# Altium integrated library Lattice CPLD ispLSI.IntLib: 471 symbols (part 21 of 26)
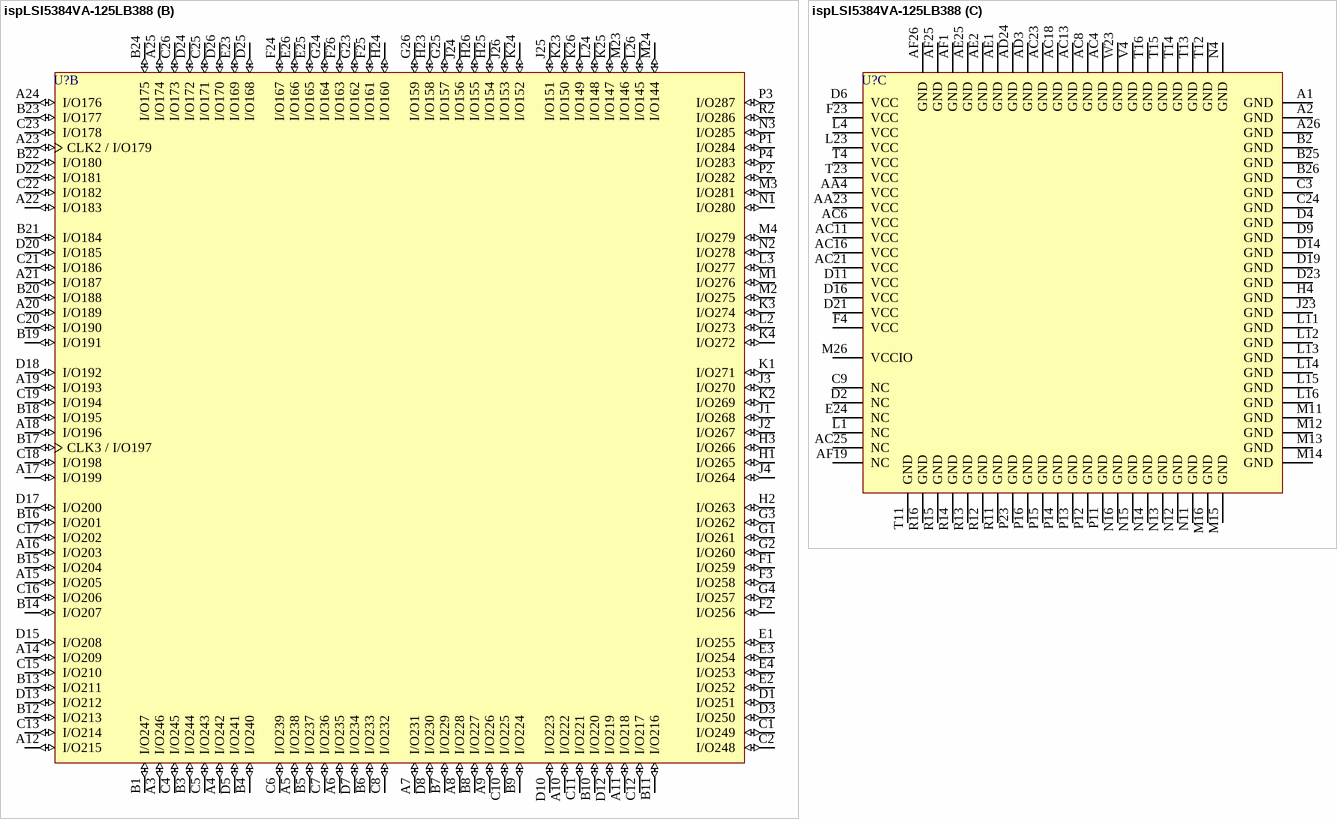
[diagram p251: symbol ispLSI5384VA-125LB388]

## ispLSI5384VA-125LB388
designator U?
In-System Programmable 3.3V SuperWIDE High Density PLD; Published: 17-Jul-2002; LatestRevisionDate: 13-Apr-2006; LatestRevisionNote: IPC-7351 Footprint Added.; DatasheetVersion: Mar-2001; PackageVersion: pkg_32, Aug-2005; PackageReference: BGA388; Publisher: Altium Limited; PackageDescription: 388-Ball Ball Grid Array (BGA388); ComponentLink1Description: Manufacturer Link; ComponentLink1URL: http://www.latticesemi.com/products/mature/index.cfm; ComponentLink2Description: Datasheet; ComponentLink2URL: http://www.latticesemi.com/account/_download.cfm?AMID=816
footprint BGA388 (BGA, 388-Leads, Body 35x35mm, Pitch 1.27mm)
3D model 5384VA-BGA388 (388-Ball Ball Grid Array (BGA388))
part A pins: A13 CLK0 (in), AA1 I/O18 (io), AA2 I/O16 (io), AA3 I/O22 (io), AA24 I/O114 (io), AA25 I/O112 (io), AA26 I/O115 (io), AB1 I/O21 (io), AB2 I/O20 (io), AB3 I/O26 (io), AB4 I/O24 (io), AB23 I/O109 (io), AB24 I/O110 (io), AB25 I/O108 (io), AB26 I/O111 (io), AC1 I/O25 (io), AC2 I/O23 (io), AC3 I/O28 (io), AC5 I/O37 (io), AC7 I/O41 (io), AC9 I/O48 (io), AC10 I/O56 (io), AC12 I/O64 (io), AC14 I/O68 (io), AC15 I/O75 (io), AC17 I/O79 (io), AC19 I/O86 (io), AC20 I/O90 (io), AC22 I/O97 (io), AC24 I/O106 (io), AC26 I/O107 (io), AD1 I/O29 (io), AD2 I/O27 (io), AD4 I/O34 (io), AD5 I/O38 (io), AD6 I/O42 (io), AD7 I/O46 (io), AD8 I/O50 (io), AD9 I/O54 (io), AD10 I/O58 (io), AD11 I/O62 (io), AD12 I/O66 (io), AD13 GOE1 (in), AD14 I/O70 (io), AD15 I/O73 (io), AD16 I/O77 (io), AD17 I/O81 (io), AD18 I/O84 (io), AD19 I/O88 (io), AD20 I/O92 (io), AD21 I/O95 (io), AD22 I/O99 (io), AD23 I/O101 (io), AD25 I/O104 (io), AD26 I/O105 (io), AE3 I/O31 (io), AE4 I/O33 (io), AE5 I/O36 (io), AE6 I/O40 (io), AE7 I/O44 (io), AE8 I/O47 (io), AE9 I/O51 (io), AE10 I/O53 (io), AE11 I/O57 (io), AE12 I/O60 (io), AE13 I/O63 (io), AE14 I/O67 (io), AE15 I/O69 (io), AE16 I/O72 (io), AE17 I/O76 (io), AE18 I/O80 (io), AE19 I/O83 (io), AE20 I/O85 (io), AE21 I/O89 (io), AE22 I/O93 (io), AE23 I/O96 (io), AE24 I/O100 (io), AE26 I/O103 (io), AF2 I/O30 (io), AF3 I/O32 (io), AF4 I/O35 (io), AF5 I/O39 (io), AF6 I/O43 (io), AF7 I/O45 (io), AF8 I/O49 (io), AF9 I/O52 (io), AF10 I/O55 (io), AF11 I/O59 (io), AF12 I/O61 (io), AF13 I/O65 (io), AF14 GOE0 (in), AF15 I/O71 (io), AF16 I/O74 (io), AF17 I/O78 (io), AF18 I/O82 (io), AF20 I/O87 (io), AF21 I/O91 (io), AF22 I/O94 (io), AF23 I/O98 (io), AF24 I/O102 (io), C14 CLK1 (in), L25 GSET/GRST (in), M25 I/O143 (io), N23 I/O140 (io), N24 TDO (out), N25 I/O139 (io), N26 I/O141 (io), P24 I/O142 (io), P25 I/O135 (io), P26 I/O137 (io), R1 TMS (in), R3 TDI (in), R4 I/O1 (io), R23 I/O136 (io), R24 I/O138 (io), R25 I/O132 (io), R26 I/O133 (io), T1 I/O0/TOE (io), T2 TCK (in), T3 I/O3 (io), T24 I/O134 (io), T25 I/O129 (io), T26 I/O131 (io), U1 I/O4 (io), U2 I/O2 (io), U3 I/O7 (io), U4 I/O5 (io), U23 I/O128 (io), U24 I/O130 (io), U25 I/O125 (io), U26 I/O127 (io), V1 I/O8 (io), V2 I/O6 (io), V3 I/O11 (io), V23 I/O120 (io), V24 I/O126 (io), V25 I/O123 (io), V26 I/O124 (io), W1 I/O10 (io), W2 I/O9 (io), W3 I/O15 (io), W4 I/O13 (io), W24 I/O122 (io), W25 I/O119 (io), W26 I/O121 (io), Y1 I/O14 (io), Y2 I/O12 (io), Y3 I/O19 (io), Y4 I/O17 (io), Y23 I/O113 (io), Y24 I/O118 (io), Y25 I/O116 (io), Y26 I/O117 (io)
part B pins: A3 I/O246 (io), A4 I/O242 (io), A5 I/O238 (io), A6 I/O235 (io), A7 I/O231 (io), A8 I/O228 (io), A9 I/O226 (io), A10 I/O222 (io), A11 I/O218 (io), A12 I/O215 (io), A14 I/O209 (io), A15 I/O205 (io), A16 I/O203 (io), A17 I/O199 (io), A18 I/O196 (io), A19 I/O193 (io), A20 I/O189 (io), A21 I/O187 (io), A22 I/O183 (io), A23 CLK2 / I/O179 (io), A24 I/O176 (io), A25 I/O174 (io), B1 I/O247 (io), B3 I/O244 (io), B4 I/O240 (io), B5 I/O237 (io), B6 I/O233 (io), B7 I/O229 (io), B8 I/O227 (io), B9 I/O224 (io), B10 I/O220 (io), B11 I/O216 (io), B12 I/O213 (io), B13 I/O211 (io), B14 I/O207 (io), B15 I/O204 (io), B16 I/O201 (io), B17 CLK3 / I/O197 (io), B18 I/O195 (io), B19 I/O191 (io), B20 I/O188 (io), B21 I/O184 (io), B22 I/O180 (io), B23 I/O177 (io), B24 I/O175 (io), C1 I/O249 (io), C2 I/O248 (io), C4 I/O245 (io), C5 I/O243 (io), C6 I/O239 (io), C7 I/O236 (io), C8 I/O232 (io), C10 I/O225 (io), C11 I/O221 (io), C12 I/O217 (io), C13 I/O214 (io), C15 I/O210 (io), C16 I/O206 (io), C17 I/O202 (io), C18 I/O198 (io), C19 I/O194 (io), C20 I/O190 (io), C21 I/O186 (io), C22 I/O182 (io), C23 I/O178 (io), C25 I/O171 (io), C26 I/O173 (io), D1 I/O251 (io), D3 I/O250 (io), D5 I/O241 (io), D7 I/O234 (io), D8 I/O230 (io), D10 I/O223 (io), D12 I/O219 (io), D13 I/O212 (io), D15 I/O208 (io), D17 I/O200 (io), D18 I/O192 (io), D20 I/O185 (io), D22 I/O181 (io), D24 I/O172 (io), D25 I/O168 (io), D26 I/O170 (io), E1 I/O255 (io), E2 I/O252 (io), E3 I/O254 (io), E4 I/O253 (io), E23 I/O169 (io), E25 I/O165 (io), E26 I/O166 (io), F1 I/O259 (io), F2 I/O256 (io), F3 I/O258 (io), F24 I/O167 (io), F25 I/O161 (io), F26 I/O163 (io), G1 I/O261 (io), G2 I/O260 (io), G3 I/O262 (io), G4 I/O257 (io), G23 I/O162 (io), G24 I/O164 (io), G25 I/O157 (io), G26 I/O159 (io), H1 I/O265 (io), H2 I/O263 (io), H3 I/O266 (io), H23 I/O158 (io), H24 I/O160 (io), H25 I/O154 (io), H26 I/O155 (io), J1 I/O268 (io), J2 I/O267 (io), J3 I/O270 (io), J4 I/O264 (io), J24 I/O156 (io), J25 I/O151 (io), J26 I/O153 (io), K1 I/O271 (io), K2 I/O269 (io), K3 I/O274 (io), K4 I/O272 (io), K23 I/O150 (io), K24 I/O152 (io), K25 I/O147 (io), K26 I/O149 (io), L2 I/O273 (io), L3 I/O277 (io), L24 I/O148 (io), L26 I/O145 (io), M1 I/O276 (io), M2 I/O275 (io), M3 I/O281 (io), M4 I/O279 (io), M23 I/O146 (io), M24 I/O144 (io), N1 I/O280 (io), N2 I/O278 (io), N3 I/O285 (io), P1 I/O284 (io), P2 I/O282 (io), P3 I/O287 (io), P4 I/O283 (io), R2 I/O286 (io)
part C pins: A1 GND (power), A2 GND (power), A26 GND (power), AA4 VCC (power), AA23 VCC (power), AC4 GND (power), AC6 VCC (power), AC8 GND (power), AC11 VCC (power), AC13 GND (power), AC16 VCC (power), AC18 GND (power), AC21 VCC (power), AC23 GND (power), AC25 NC, AD3 GND (power), AD24 GND (power), AE1 GND (power), AE2 GND (power), AE25 GND (power), AF1 GND (power), AF19 NC, AF25 GND (power), AF26 GND (power), B2 GND (power), B25 GND (power), B26 GND (power), C3 GND (power), C9 NC, C24 GND (power), D2 NC, D4 GND (power), D6 VCC (power), D9 GND (power), D11 VCC (power), D14 GND (power), D16 VCC (power), D19 GND (power), D21 VCC (power), D23 GND (power), E24 NC, F4 VCC (power), F23 VCC (power), H4 GND (power), J23 GND (power), L1 NC, L4 VCC (power), L11 GND (power), L12 GND (power), L13 GND (power), L14 GND (power), L15 GND (power), L16 GND (power), L23 VCC (power), M11 GND (power), M12 GND (power), M13 GND (power), M14 GND (power), M15 GND (power), M16 GND (power), M26 VCCIO (power), N4 GND (power), N11 GND (power), N12 GND (power), N13 GND (power), N14 GND (power), N15 GND (power), N16 GND (power), P11 GND (power), P12 GND (power), P13 GND (power), P14 GND (power), P15 GND (power), P16 GND (power), P23 GND (power), R11 GND (power), R12 GND (power), R13 GND (power), R14 GND (power), R15 GND (power), R16 GND (power), T4 VCC (power), T11 GND (power), T12 GND (power), T13 GND (power), T14 GND (power), T15 GND (power), T16 GND (power), T23 VCC (power), V4 GND (power), W23 GND (power)

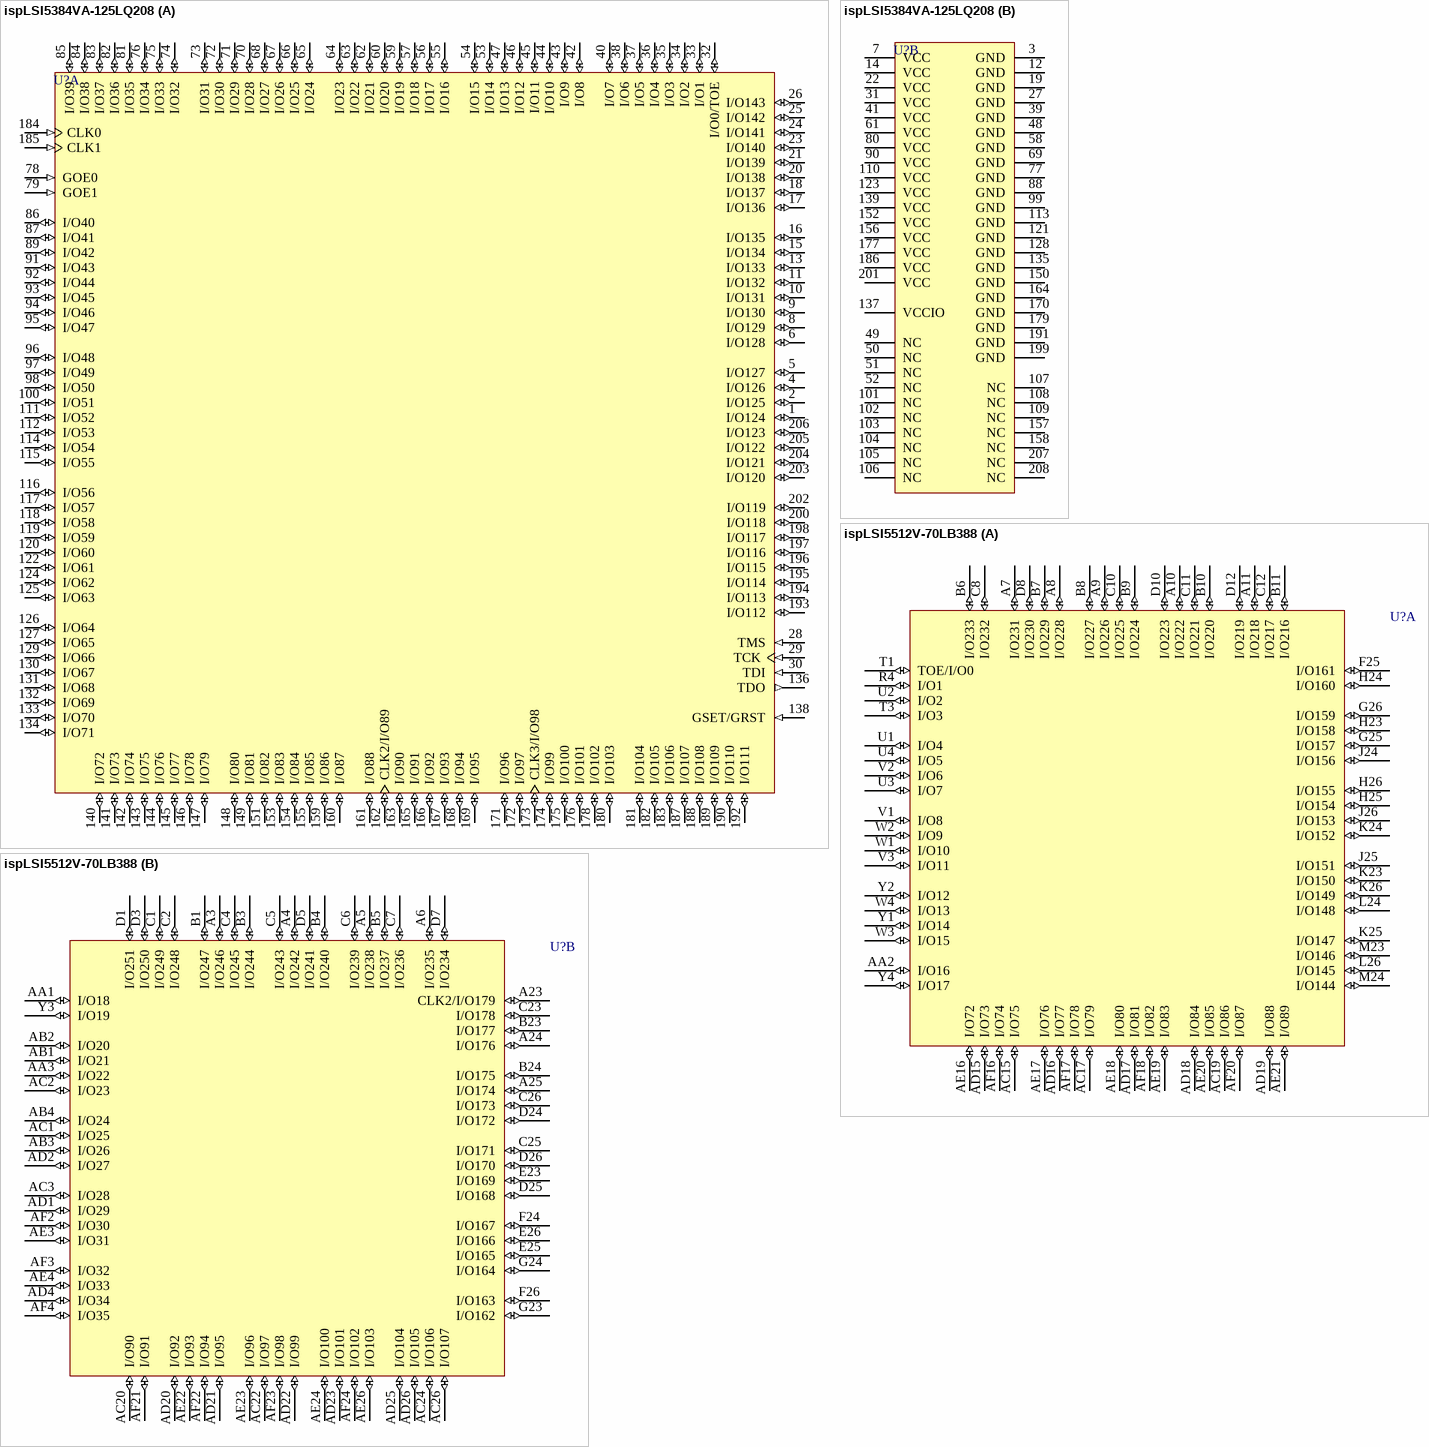
[diagram p197: symbols ispLSI5384VA-125LQ208 to ispLSI5512V-70LB388]

## ispLSI5384VA-125LQ208
designator U?
In-System Programmable 3.3V SuperWIDE High Density PLD; Published: 17-Jul-2002; LatestRevisionDate: 13-Apr-2006; LatestRevisionNote: IPC-7351 Footprint Added.; DatasheetVersion: Mar-2001; PackageVersion: pkg_32, Aug-2005; PackageReference: PQFP208; Publisher: Altium Limited; PackageDescription: 208-Pin Plastic Quad Flat Pack (PQFP208); Code_JEDEC: MO-143-FAI; ComponentLink1Description: Manufacturer Link; ComponentLink1URL: http://www.latticesemi.com/products/mature/index.cfm; ComponentLink2Description: Datasheet; ComponentLink2URL: http://www.latticesemi.com/account/_download.cfm?AMID=816
footprint PQFP208_N (Shrink QFP, 208-Leads, Body 28x28mm, Pitch 0.5mm, IPC Medium Density)
footprint PQFP208_L (Shrink QFP, 208-Leads, Body 28x28mm, Pitch 0.5mm, IPC High Density)
footprint PQFP208_M (Shrink QFP, 208-Leads, Body 28x28mm, Pitch 0.5mm, IPC Low Density)
3D model 5384VA-PQFP208 (208-Pin Plastic Quad Flat Pack (PQFP208))
part A pins: 1 I/O124 (io), 2 I/O125 (io), 4 I/O126 (io), 5 I/O127 (io), 6 I/O128 (io), 8 I/O129 (io), 9 I/O130 (io), 10 I/O131 (io), 11 I/O132 (io), 13 I/O133 (io), 15 I/O134 (io), 16 I/O135 (io), 17 I/O136 (io), 18 I/O137 (io), 20 I/O138 (io), 21 I/O139 (io), 23 I/O140 (io), 24 I/O141 (io), 25 I/O142 (io), 26 I/O143 (io), 28 TMS (in), 29 TCK (in), 30 TDI (in), 32 I/O0/TOE (io), 33 I/O1 (io), 34 I/O2 (io), 35 I/O3 (io), 36 I/O4 (io), 37 I/O5 (io), 38 I/O6 (io), 40 I/O7 (io), 42 I/O8 (io), 43 I/O9 (io), 44 I/O10 (io), 45 I/O11 (io), 46 I/O12 (io), 47 I/O13 (io), 53 I/O14 (io), 54 I/O15 (io), 55 I/O16 (io), 56 I/O17 (io), 57 I/O18 (io), 59 I/O19 (io), 60 I/O20 (io), 62 I/O21 (io), 63 I/O22 (io), 64 I/O23 (io), 65 I/O24 (io), 66 I/O25 (io), 67 I/O26 (io), 68 I/O27 (io), 70 I/O28 (io), 71 I/O29 (io), 72 I/O30 (io), 73 I/O31 (io), 74 I/O32 (io), 75 I/O33 (io), 76 I/O34 (io), 78 GOE0 (in), 79 GOE1 (in), 81 I/O35 (io), 82 I/O36 (io), 83 I/O37 (io), 84 I/O38 (io), 85 I/O39 (io), 86 I/O40 (io), 87 I/O41 (io), 89 I/O42 (io), 91 I/O43 (io), 92 I/O44 (io), 93 I/O45 (io), 94 I/O46 (io), 95 I/O47 (io), 96 I/O48 (io), 97 I/O49 (io), 98 I/O50 (io), 100 I/O51 (io), 111 I/O52 (io), 112 I/O53 (io), 114 I/O54 (io), 115 I/O55 (io), 116 I/O56 (io), 117 I/O57 (io), 118 I/O58 (io), 119 I/O59 (io), 120 I/O60 (io), 122 I/O61 (io), 124 I/O62 (io), 125 I/O63 (io), 126 I/O64 (io), 127 I/O65 (io), 129 I/O66 (io), 130 I/O67 (io), 131 I/O68 (io), 132 I/O69 (io), 133 I/O70 (io), 134 I/O71 (io), 136 TDO (out), 138 GSET/GRST (in), 140 I/O72 (io), 141 I/O73 (io), 142 I/O74 (io), 143 I/O75 (io), 144 I/O76 (io), 145 I/O77 (io), 146 I/O78 (io), 147 I/O79 (io), 148 I/O80 (io), 149 I/O81 (io), 151 I/O82 (io), 153 I/O83 (io), 154 I/O84 (io), 155 I/O85 (io), 159 I/O86 (io), 160 I/O87 (io), 161 I/O88 (io), 162 CLK2/I/O89 (io), 163 I/O90 (io), 165 I/O91 (io), 166 I/O92 (io), 167 I/O93 (io), 168 I/O94 (io), 169 I/O95 (io), 171 I/O96 (io), 172 I/O97 (io), 173 CLK3/I/O98 (io), 174 I/O99 (io), 175 I/O100 (io), 176 I/O101 (io), 178 I/O102 (io), 180 I/O103 (io), 181 I/O104 (io), 182 I/O105 (io), 183 I/O106 (io), 184 CLK0 (in), 185 CLK1 (in), 187 I/O107 (io), 188 I/O108 (io), 189 I/O109 (io), 190 I/O110 (io), 192 I/O111 (io), 193 I/O112 (io), 194 I/O113 (io), 195 I/O114 (io), 196 I/O115 (io), 197 I/O116 (io), 198 I/O117 (io), 200 I/O118 (io), 202 I/O119 (io), 203 I/O120 (io), 204 I/O121 (io), 205 I/O122 (io), 206 I/O123 (io)
part B pins: 3 GND (power), 7 VCC (power), 12 GND (power), 14 VCC (power), 19 GND (power), 22 VCC (power), 27 GND (power), 31 VCC (power), 39 GND (power), 41 VCC (power), 48 GND (power), 49 NC, 50 NC, 51 NC, 52 NC, 58 GND (power), 61 VCC (power), 69 GND (power), 77 GND (power), 80 VCC (power), 88 GND (power), 90 VCC (power), 99 GND (power), 101 NC, 102 NC, 103 NC, 104 NC, 105 NC, 106 NC, 107 NC, 108 NC, 109 NC, 110 VCC (power), 113 GND (power), 121 GND (power), 123 VCC (power), 128 GND (power), 135 GND (power), 137 VCCIO (power), 139 VCC (power), 150 GND (power), 152 VCC (power), 156 VCC (power), 157 NC, 158 NC, 164 GND (power), 170 GND (power), 177 VCC (power), 179 GND (power), 186 VCC (power), 191 GND (power), 199 GND (power), 201 VCC (power), 207 NC, 208 NC

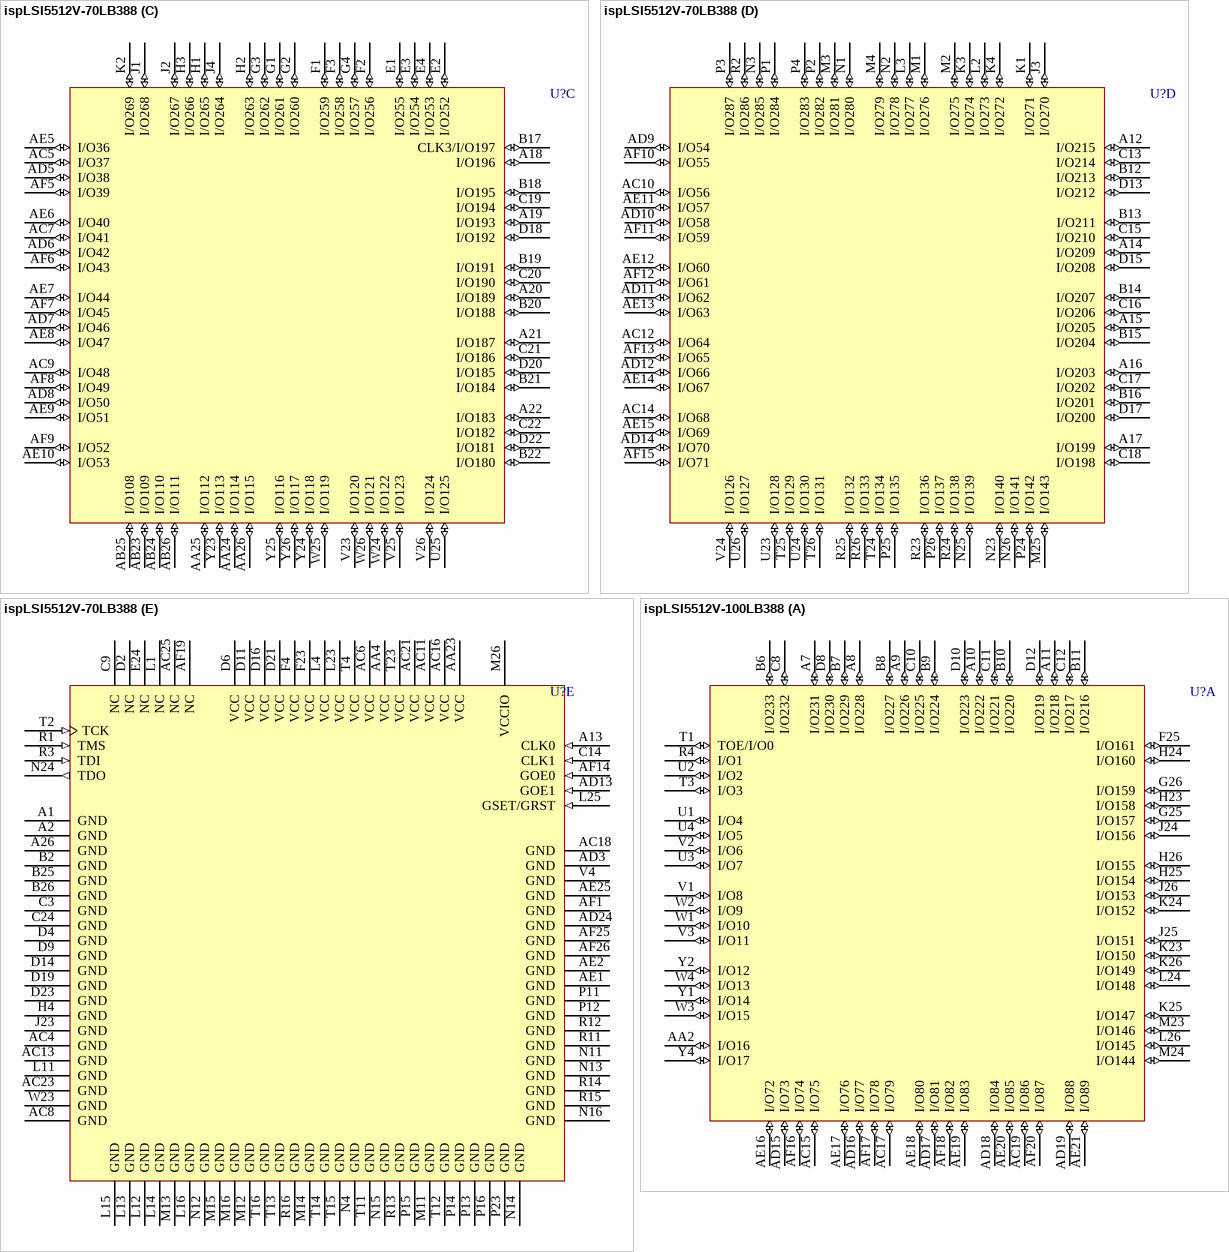
[diagram p198: symbols ispLSI5512V-70LB388 to ispLSI5512V-100LB388]

## ispLSI5512V-70LB388
designator U?
In-System Programmable 3.3V SuperWIDE High-Density PLD; Note: I/O179 is multiplexed with CLK2; I/O197 is multiplexed with CLK3; I/O0 is multiplexed with TOE.; Published: 23-Sep-2002; LatestRevisionDate: 13-Apr-2006; LatestRevisionNote: IPC-7351 Footprint Added.; DatasheetVersion: May-1999; PackageVersion: pkg_32, Aug-2005; PackageReference: BGA388; Publisher: Altium Limited; PackageDescription: 388-Ball Ball Grid Array (BGA388); ComponentLink1Description: Manufacturer Link; ComponentLink1URL: http://www.latticesemi.com/products/mature/index.cfm; ComponentLink2Description: Datasheet; ComponentLink2URL: http://www.latticesemi.com/account/_download.cfm?AMID=1166
footprint BGA388 (BGA, 388-Leads, Body 35x35mm, Pitch 1.27mm)
3D model 5512V-BGA388 (388-Ball Ball Grid Array (BGA388))
part A pins: A7 I/O231 (io), A8 I/O228 (io), A9 I/O226 (io), A10 I/O222 (io), A11 I/O218 (io), AA2 I/O16 (io), AC15 I/O75 (io), AC17 I/O79 (io), AC19 I/O86 (io), AD15 I/O73 (io), AD16 I/O77 (io), AD17 I/O81 (io), AD18 I/O84 (io), AD19 I/O88 (io), AE16 I/O72 (io), AE17 I/O76 (io), AE18 I/O80 (io), AE19 I/O83 (io), AE20 I/O85 (io), AE21 I/O89 (io), AF16 I/O74 (io), AF17 I/O78 (io), AF18 I/O82 (io), AF20 I/O87 (io), B6 I/O233 (io), B7 I/O229 (io), B8 I/O227 (io), B9 I/O224 (io), B10 I/O220 (io), B11 I/O216 (io), C8 I/O232 (io), C10 I/O225 (io), C11 I/O221 (io), C12 I/O217 (io), D8 I/O230 (io), D10 I/O223 (io), D12 I/O219 (io), F25 I/O161 (io), G25 I/O157 (io), G26 I/O159 (io), H23 I/O158 (io), H24 I/O160 (io), H25 I/O154 (io), H26 I/O155 (io), J24 I/O156 (io), J25 I/O151 (io), J26 I/O153 (io), K23 I/O150 (io), K24 I/O152 (io), K25 I/O147 (io), K26 I/O149 (io), L24 I/O148 (io), L26 I/O145 (io), M23 I/O146 (io), M24 I/O144 (io), R4 I/O1 (io), T1 TOE/I/O0 (io), T3 I/O3 (io), U1 I/O4 (io), U2 I/O2 (io), U3 I/O7 (io), U4 I/O5 (io), V1 I/O8 (io), V2 I/O6 (io), V3 I/O11 (io), W1 I/O10 (io), W2 I/O9 (io), W3 I/O15 (io), W4 I/O13 (io), Y1 I/O14 (io), Y2 I/O12 (io), Y4 I/O17 (io)
part B pins: A3 I/O246 (io), A4 I/O242 (io), A5 I/O238 (io), A6 I/O235 (io), A23 CLK2/I/O179 (io), A24 I/O176 (io), A25 I/O174 (io), AA1 I/O18 (io), AA3 I/O22 (io), AB1 I/O21 (io), AB2 I/O20 (io), AB3 I/O26 (io), AB4 I/O24 (io), AC1 I/O25 (io), AC2 I/O23 (io), AC3 I/O28 (io), AC20 I/O90 (io), AC22 I/O97 (io), AC24 I/O106 (io), AC26 I/O107 (io), AD1 I/O29 (io), AD2 I/O27 (io), AD4 I/O34 (io), AD20 I/O92 (io), AD21 I/O95 (io), AD22 I/O99 (io), AD23 I/O101 (io), AD25 I/O104 (io), AD26 I/O105 (io), AE3 I/O31 (io), AE4 I/O33 (io), AE22 I/O93 (io), AE23 I/O96 (io), AE24 I/O100 (io), AE26 I/O103 (io), AF2 I/O30 (io), AF3 I/O32 (io), AF4 I/O35 (io), AF21 I/O91 (io), AF22 I/O94 (io), AF23 I/O98 (io), AF24 I/O102 (io), B1 I/O247 (io), B3 I/O244 (io), B4 I/O240 (io), B5 I/O237 (io), B23 I/O177 (io), B24 I/O175 (io), C1 I/O249 (io), C2 I/O248 (io), C4 I/O245 (io), C5 I/O243 (io), C6 I/O239 (io), C7 I/O236 (io), C23 I/O178 (io), C25 I/O171 (io), C26 I/O173 (io), D1 I/O251 (io), D3 I/O250 (io), D5 I/O241 (io), D7 I/O234 (io), D24 I/O172 (io), D25 I/O168 (io), D26 I/O170 (io), E23 I/O169 (io), E25 I/O165 (io), E26 I/O166 (io), F24 I/O167 (io), F26 I/O163 (io), G23 I/O162 (io), G24 I/O164 (io), Y3 I/O19 (io)
part C pins: A18 I/O196 (io), A19 I/O193 (io), A20 I/O189 (io), A21 I/O187 (io), A22 I/O183 (io), AA24 I/O114 (io), AA25 I/O112 (io), AA26 I/O115 (io), AB23 I/O109 (io), AB24 I/O110 (io), AB25 I/O108 (io), AB26 I/O111 (io), AC5 I/O37 (io), AC7 I/O41 (io), AC9 I/O48 (io), AD5 I/O38 (io), AD6 I/O42 (io), AD7 I/O46 (io), AD8 I/O50 (io), AE5 I/O36 (io), AE6 I/O40 (io), AE7 I/O44 (io), AE8 I/O47 (io), AE9 I/O51 (io), AE10 I/O53 (io), AF5 I/O39 (io), AF6 I/O43 (io), AF7 I/O45 (io), AF8 I/O49 (io), AF9 I/O52 (io), B17 CLK3/I/O197 (io), B18 I/O195 (io), B19 I/O191 (io), B20 I/O188 (io), B21 I/O184 (io), B22 I/O180 (io), C19 I/O194 (io), C20 I/O190 (io), C21 I/O186 (io), C22 I/O182 (io), D18 I/O192 (io), D20 I/O185 (io), D22 I/O181 (io), E1 I/O255 (io), E2 I/O252 (io), E3 I/O254 (io), E4 I/O253 (io), F1 I/O259 (io), F2 I/O256 (io), F3 I/O258 (io), G1 I/O261 (io), G2 I/O260 (io), G3 I/O262 (io), G4 I/O257 (io), H1 I/O265 (io), H2 I/O263 (io), H3 I/O266 (io), J1 I/O268 (io), J2 I/O267 (io), J4 I/O264 (io), K2 I/O269 (io), U25 I/O125 (io), V23 I/O120 (io), V25 I/O123 (io), V26 I/O124 (io), W24 I/O122 (io), W25 I/O119 (io), W26 I/O121 (io), Y23 I/O113 (io), Y24 I/O118 (io), Y25 I/O116 (io), Y26 I/O117 (io)
part D pins: A12 I/O215 (io), A14 I/O209 (io), A15 I/O205 (io), A16 I/O203 (io), A17 I/O199 (io), AC10 I/O56 (io), AC12 I/O64 (io), AC14 I/O68 (io), AD9 I/O54 (io), AD10 I/O58 (io), AD11 I/O62 (io), AD12 I/O66 (io), AD14 I/O70 (io), AE11 I/O57 (io), AE12 I/O60 (io), AE13 I/O63 (io), AE14 I/O67 (io), AE15 I/O69 (io), AF10 I/O55 (io), AF11 I/O59 (io), AF12 I/O61 (io), AF13 I/O65 (io), AF15 I/O71 (io), B12 I/O213 (io), B13 I/O211 (io), B14 I/O207 (io), B15 I/O204 (io), B16 I/O201 (io), C13 I/O214 (io), C15 I/O210 (io), C16 I/O206 (io), C17 I/O202 (io), C18 I/O198 (io), D13 I/O212 (io), D15 I/O208 (io), D17 I/O200 (io), J3 I/O270 (io), K1 I/O271 (io), K3 I/O274 (io), K4 I/O272 (io), L2 I/O273 (io), L3 I/O277 (io), M1 I/O276 (io), M2 I/O275 (io), M3 I/O281 (io), M4 I/O279 (io), M25 I/O143 (io), N1 I/O280 (io), N2 I/O278 (io), N3 I/O285 (io), N23 I/O140 (io), N25 I/O139 (io), N26 I/O141 (io), P1 I/O284 (io), P2 I/O282 (io), P3 I/O287 (io), P4 I/O283 (io), P24 I/O142 (io), P25 I/O135 (io), P26 I/O137 (io), R2 I/O286 (io), R23 I/O136 (io), R24 I/O138 (io), R25 I/O132 (io), R26 I/O133 (io), T24 I/O134 (io), T25 I/O129 (io), T26 I/O131 (io), U23 I/O128 (io), U24 I/O130 (io), U26 I/O127 (io), V24 I/O126 (io)
part E pins: A1 GND (power), A2 GND (power), A13 CLK0 (in), A26 GND (power), AA4 VCC (power), AA23 VCC (power), AC4 GND (power), AC6 VCC (power), AC8 GND (power), AC11 VCC (power), AC13 GND (power), AC16 VCC (power), AC18 GND (power), AC21 VCC (power), AC23 GND (power), AC25 NC, AD3 GND (power), AD13 GOE1 (in), AD24 GND (power), AE1 GND (power), AE2 GND (power), AE25 GND (power), AF1 GND (power), AF14 GOE0 (in), AF19 NC, AF25 GND (power), AF26 GND (power), B2 GND (power), B25 GND (power), B26 GND (power), C3 GND (power), C9 NC, C14 CLK1 (in), C24 GND (power), D2 NC, D4 GND (power), D6 VCC (power), D9 GND (power), D11 VCC (power), D14 GND (power), D16 VCC (power), D19 GND (power), D21 VCC (power), D23 GND (power), E24 NC, F4 VCC (power), F23 VCC (power), H4 GND (power), J23 GND (power), L1 NC, L4 VCC (power), L11 GND (power), L12 GND (power), L13 GND (power), L14 GND (power), L15 GND (power), L16 GND (power), L23 VCC (power), L25 GSET/GRST (in), M11 GND (power), M12 GND (power), M13 GND (power), M14 GND (power), M15 GND (power), M16 GND (power), M26 VCCIO (power), N4 GND (power), N11 GND (power), N12 GND (power), N13 GND (power), N14 GND (power), N15 GND (power), N16 GND (power), N24 TDO (out), P11 GND (power), P12 GND (power), P13 GND (power), P14 GND (power), P15 GND (power), P16 GND (power), P23 GND (power), R1 TMS (in), R3 TDI (in), R11 GND (power), R12 GND (power), R13 GND (power), R14 GND (power), R15 GND (power), R16 GND (power), T2 TCK (in), T4 VCC (power), T11 GND (power), T12 GND (power), T13 GND (power), T14 GND (power), T15 GND (power), T16 GND (power), T23 VCC (power), V4 GND (power), W23 GND (power)

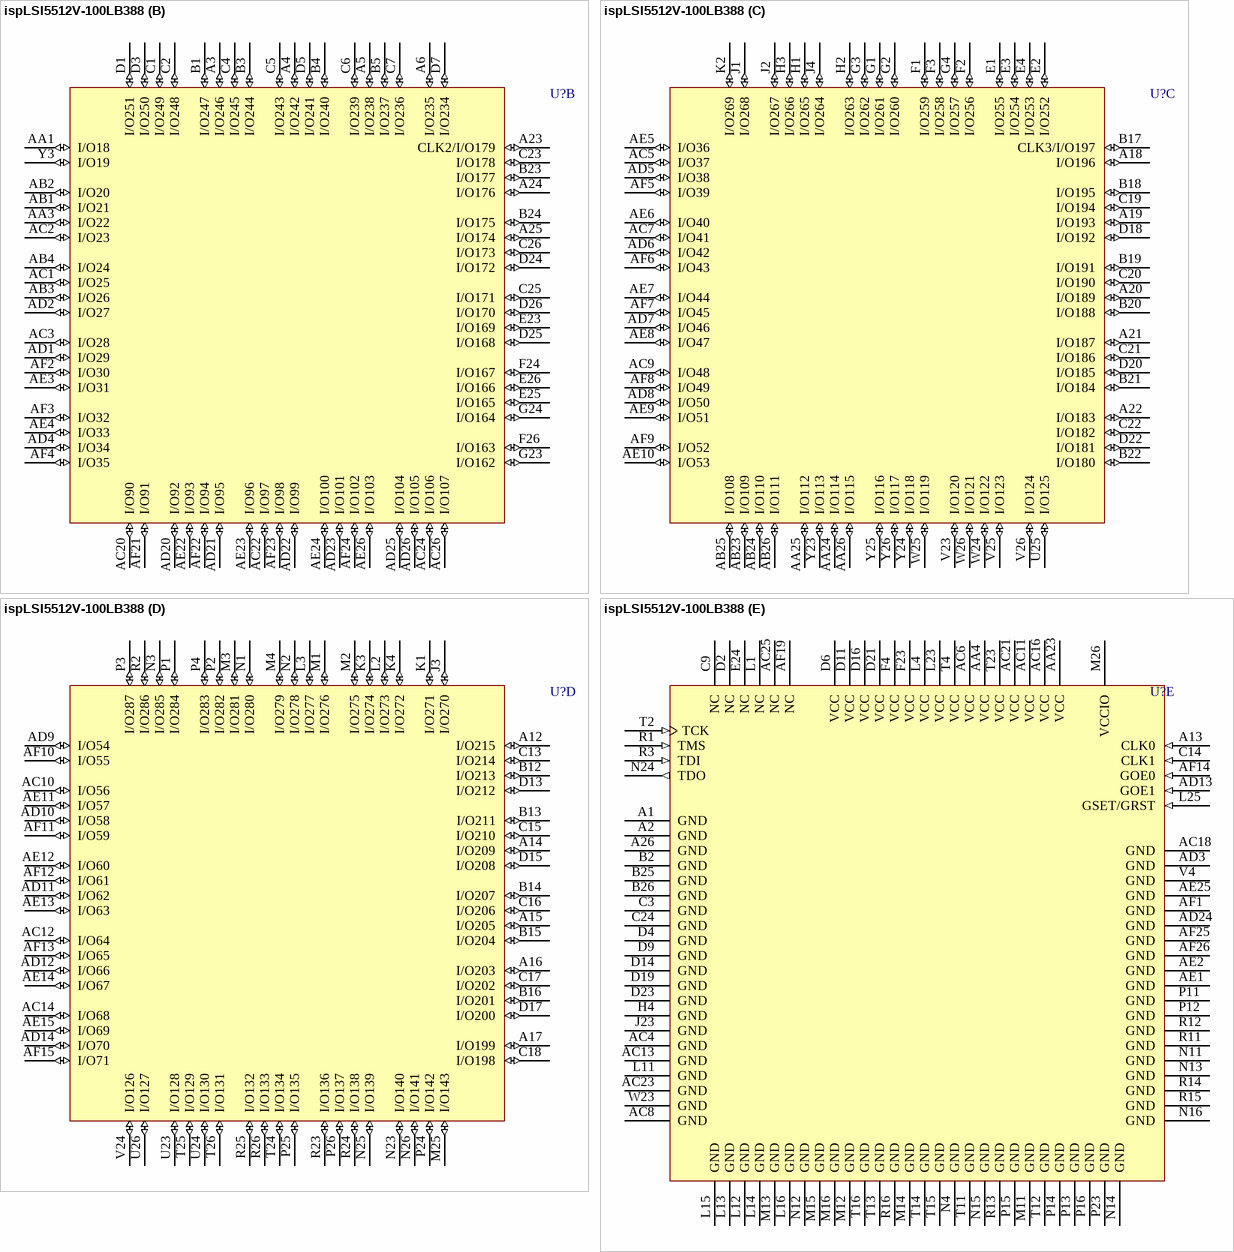
[diagram p199: symbol ispLSI5512V-100LB388]

## ispLSI5512V-100LB388
designator U?
In-System Programmable 3.3V SuperWIDE High-Density PLD; Note: I/O179 is multiplexed with CLK2; I/O197 is multiplexed with CLK3; I/O0 is multiplexed with TOE.; Published: 23-Sep-2002; LatestRevisionDate: 13-Apr-2006; LatestRevisionNote: IPC-7351 Footprint Added.; DatasheetVersion: May-1999; PackageVersion: pkg_32, Aug-2005; PackageReference: BGA388; Publisher: Altium Limited; PackageDescription: 388-Ball Ball Grid Array (BGA388); ComponentLink1Description: Manufacturer Link; ComponentLink1URL: http://www.latticesemi.com/products/mature/index.cfm; ComponentLink2Description: Datasheet; ComponentLink2URL: http://www.latticesemi.com/account/_download.cfm?AMID=1166
footprint BGA388 (BGA, 388-Leads, Body 35x35mm, Pitch 1.27mm)
3D model 5512V-BGA388 (388-Ball Ball Grid Array (BGA388))
part A pins: A7 I/O231 (io), A8 I/O228 (io), A9 I/O226 (io), A10 I/O222 (io), A11 I/O218 (io), AA2 I/O16 (io), AC15 I/O75 (io), AC17 I/O79 (io), AC19 I/O86 (io), AD15 I/O73 (io), AD16 I/O77 (io), AD17 I/O81 (io), AD18 I/O84 (io), AD19 I/O88 (io), AE16 I/O72 (io), AE17 I/O76 (io), AE18 I/O80 (io), AE19 I/O83 (io), AE20 I/O85 (io), AE21 I/O89 (io), AF16 I/O74 (io), AF17 I/O78 (io), AF18 I/O82 (io), AF20 I/O87 (io), B6 I/O233 (io), B7 I/O229 (io), B8 I/O227 (io), B9 I/O224 (io), B10 I/O220 (io), B11 I/O216 (io), C8 I/O232 (io), C10 I/O225 (io), C11 I/O221 (io), C12 I/O217 (io), D8 I/O230 (io), D10 I/O223 (io), D12 I/O219 (io), F25 I/O161 (io), G25 I/O157 (io), G26 I/O159 (io), H23 I/O158 (io), H24 I/O160 (io), H25 I/O154 (io), H26 I/O155 (io), J24 I/O156 (io), J25 I/O151 (io), J26 I/O153 (io), K23 I/O150 (io), K24 I/O152 (io), K25 I/O147 (io), K26 I/O149 (io), L24 I/O148 (io), L26 I/O145 (io), M23 I/O146 (io), M24 I/O144 (io), R4 I/O1 (io), T1 TOE/I/O0 (io), T3 I/O3 (io), U1 I/O4 (io), U2 I/O2 (io), U3 I/O7 (io), U4 I/O5 (io), V1 I/O8 (io), V2 I/O6 (io), V3 I/O11 (io), W1 I/O10 (io), W2 I/O9 (io), W3 I/O15 (io), W4 I/O13 (io), Y1 I/O14 (io), Y2 I/O12 (io), Y4 I/O17 (io)
part B pins: A3 I/O246 (io), A4 I/O242 (io), A5 I/O238 (io), A6 I/O235 (io), A23 CLK2/I/O179 (io), A24 I/O176 (io), A25 I/O174 (io), AA1 I/O18 (io), AA3 I/O22 (io), AB1 I/O21 (io), AB2 I/O20 (io), AB3 I/O26 (io), AB4 I/O24 (io), AC1 I/O25 (io), AC2 I/O23 (io), AC3 I/O28 (io), AC20 I/O90 (io), AC22 I/O97 (io), AC24 I/O106 (io), AC26 I/O107 (io), AD1 I/O29 (io), AD2 I/O27 (io), AD4 I/O34 (io), AD20 I/O92 (io), AD21 I/O95 (io), AD22 I/O99 (io), AD23 I/O101 (io), AD25 I/O104 (io), AD26 I/O105 (io), AE3 I/O31 (io), AE4 I/O33 (io), AE22 I/O93 (io), AE23 I/O96 (io), AE24 I/O100 (io), AE26 I/O103 (io), AF2 I/O30 (io), AF3 I/O32 (io), AF4 I/O35 (io), AF21 I/O91 (io), AF22 I/O94 (io), AF23 I/O98 (io), AF24 I/O102 (io), B1 I/O247 (io), B3 I/O244 (io), B4 I/O240 (io), B5 I/O237 (io), B23 I/O177 (io), B24 I/O175 (io), C1 I/O249 (io), C2 I/O248 (io), C4 I/O245 (io), C5 I/O243 (io), C6 I/O239 (io), C7 I/O236 (io), C23 I/O178 (io), C25 I/O171 (io), C26 I/O173 (io), D1 I/O251 (io), D3 I/O250 (io), D5 I/O241 (io), D7 I/O234 (io), D24 I/O172 (io), D25 I/O168 (io), D26 I/O170 (io), E23 I/O169 (io), E25 I/O165 (io), E26 I/O166 (io), F24 I/O167 (io), F26 I/O163 (io), G23 I/O162 (io), G24 I/O164 (io), Y3 I/O19 (io)
part C pins: A18 I/O196 (io), A19 I/O193 (io), A20 I/O189 (io), A21 I/O187 (io), A22 I/O183 (io), AA24 I/O114 (io), AA25 I/O112 (io), AA26 I/O115 (io), AB23 I/O109 (io), AB24 I/O110 (io), AB25 I/O108 (io), AB26 I/O111 (io), AC5 I/O37 (io), AC7 I/O41 (io), AC9 I/O48 (io), AD5 I/O38 (io), AD6 I/O42 (io), AD7 I/O46 (io), AD8 I/O50 (io), AE5 I/O36 (io), AE6 I/O40 (io), AE7 I/O44 (io), AE8 I/O47 (io), AE9 I/O51 (io), AE10 I/O53 (io), AF5 I/O39 (io), AF6 I/O43 (io), AF7 I/O45 (io), AF8 I/O49 (io), AF9 I/O52 (io), B17 CLK3/I/O197 (io), B18 I/O195 (io), B19 I/O191 (io), B20 I/O188 (io), B21 I/O184 (io), B22 I/O180 (io), C19 I/O194 (io), C20 I/O190 (io), C21 I/O186 (io), C22 I/O182 (io), D18 I/O192 (io), D20 I/O185 (io), D22 I/O181 (io), E1 I/O255 (io), E2 I/O252 (io), E3 I/O254 (io), E4 I/O253 (io), F1 I/O259 (io), F2 I/O256 (io), F3 I/O258 (io), G1 I/O261 (io), G2 I/O260 (io), G3 I/O262 (io), G4 I/O257 (io), H1 I/O265 (io), H2 I/O263 (io), H3 I/O266 (io), J1 I/O268 (io), J2 I/O267 (io), J4 I/O264 (io), K2 I/O269 (io), U25 I/O125 (io), V23 I/O120 (io), V25 I/O123 (io), V26 I/O124 (io), W24 I/O122 (io), W25 I/O119 (io), W26 I/O121 (io), Y23 I/O113 (io), Y24 I/O118 (io), Y25 I/O116 (io), Y26 I/O117 (io)
part D pins: A12 I/O215 (io), A14 I/O209 (io), A15 I/O205 (io), A16 I/O203 (io), A17 I/O199 (io), AC10 I/O56 (io), AC12 I/O64 (io), AC14 I/O68 (io), AD9 I/O54 (io), AD10 I/O58 (io), AD11 I/O62 (io), AD12 I/O66 (io), AD14 I/O70 (io), AE11 I/O57 (io), AE12 I/O60 (io), AE13 I/O63 (io), AE14 I/O67 (io), AE15 I/O69 (io), AF10 I/O55 (io), AF11 I/O59 (io), AF12 I/O61 (io), AF13 I/O65 (io), AF15 I/O71 (io), B12 I/O213 (io), B13 I/O211 (io), B14 I/O207 (io), B15 I/O204 (io), B16 I/O201 (io), C13 I/O214 (io), C15 I/O210 (io), C16 I/O206 (io), C17 I/O202 (io), C18 I/O198 (io), D13 I/O212 (io), D15 I/O208 (io), D17 I/O200 (io), J3 I/O270 (io), K1 I/O271 (io), K3 I/O274 (io), K4 I/O272 (io), L2 I/O273 (io), L3 I/O277 (io), M1 I/O276 (io), M2 I/O275 (io), M3 I/O281 (io), M4 I/O279 (io), M25 I/O143 (io), N1 I/O280 (io), N2 I/O278 (io), N3 I/O285 (io), N23 I/O140 (io), N25 I/O139 (io), N26 I/O141 (io), P1 I/O284 (io), P2 I/O282 (io), P3 I/O287 (io), P4 I/O283 (io), P24 I/O142 (io), P25 I/O135 (io), P26 I/O137 (io), R2 I/O286 (io), R23 I/O136 (io), R24 I/O138 (io), R25 I/O132 (io), R26 I/O133 (io), T24 I/O134 (io), T25 I/O129 (io), T26 I/O131 (io), U23 I/O128 (io), U24 I/O130 (io), U26 I/O127 (io), V24 I/O126 (io)
part E pins: A1 GND (power), A2 GND (power), A13 CLK0 (in), A26 GND (power), AA4 VCC (power), AA23 VCC (power), AC4 GND (power), AC6 VCC (power), AC8 GND (power), AC11 VCC (power), AC13 GND (power), AC16 VCC (power), AC18 GND (power), AC21 VCC (power), AC23 GND (power), AC25 NC, AD3 GND (power), AD13 GOE1 (in), AD24 GND (power), AE1 GND (power), AE2 GND (power), AE25 GND (power), AF1 GND (power), AF14 GOE0 (in), AF19 NC, AF25 GND (power), AF26 GND (power), B2 GND (power), B25 GND (power), B26 GND (power), C3 GND (power), C9 NC, C14 CLK1 (in), C24 GND (power), D2 NC, D4 GND (power), D6 VCC (power), D9 GND (power), D11 VCC (power), D14 GND (power), D16 VCC (power), D19 GND (power), D21 VCC (power), D23 GND (power), E24 NC, F4 VCC (power), F23 VCC (power), H4 GND (power), J23 GND (power), L1 NC, L4 VCC (power), L11 GND (power), L12 GND (power), L13 GND (power), L14 GND (power), L15 GND (power), L16 GND (power), L23 VCC (power), L25 GSET/GRST (in), M11 GND (power), M12 GND (power), M13 GND (power), M14 GND (power), M15 GND (power), M16 GND (power), M26 VCCIO (power), N4 GND (power), N11 GND (power), N12 GND (power), N13 GND (power), N14 GND (power), N15 GND (power), N16 GND (power), N24 TDO (out), P11 GND (power), P12 GND (power), P13 GND (power), P14 GND (power), P15 GND (power), P16 GND (power), P23 GND (power), R1 TMS (in), R3 TDI (in), R11 GND (power), R12 GND (power), R13 GND (power), R14 GND (power), R15 GND (power), R16 GND (power), T2 TCK (in), T4 VCC (power), T11 GND (power), T12 GND (power), T13 GND (power), T14 GND (power), T15 GND (power), T16 GND (power), T23 VCC (power), V4 GND (power), W23 GND (power)

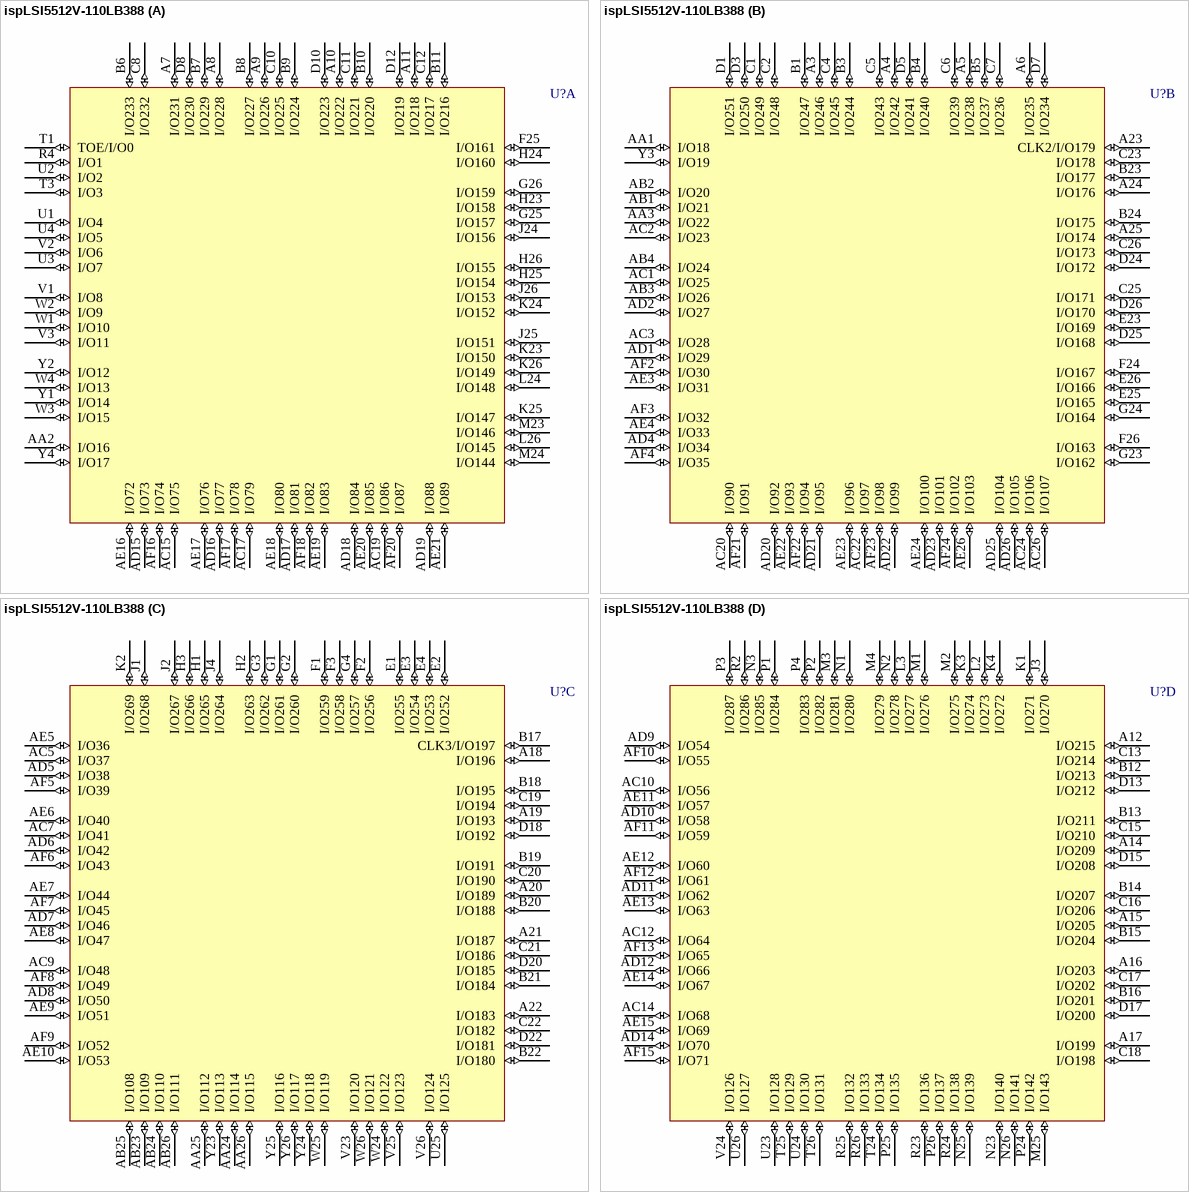
[diagram p200: symbol ispLSI5512V-110LB388]
